# Altium footprint library Austindetz_CM4_Board_v1.0.PcbLib: 102 footprints (part 6 of 7)
Each footprint in its own frame and in the unit in brackets; x right, y up, seen from the top. Pads: shape width x height; smd on the part's side, far side on the other; paste and mask are expansions set on the pad; w line width, h text height; cw(c..) or ccw(c..) is an arc to the next point about the centre after c.
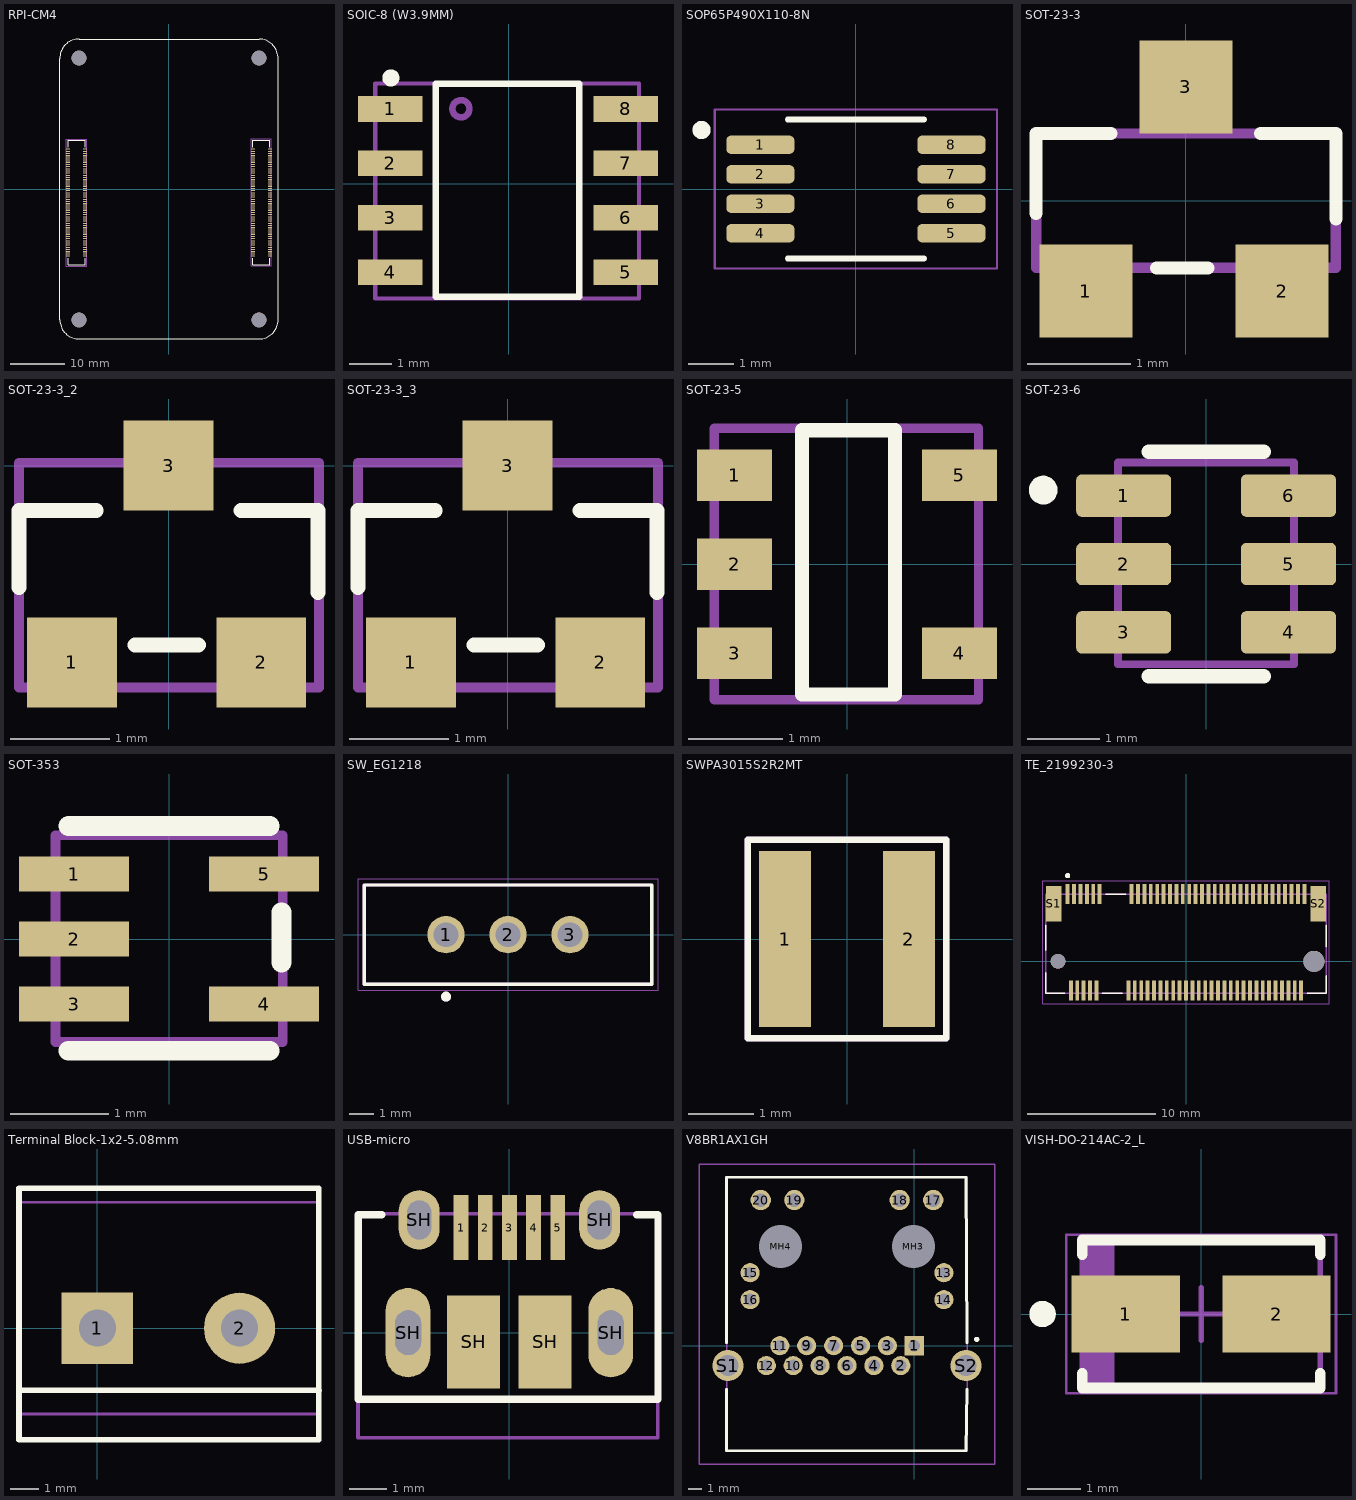
[diagram p5: the footprints below, top view; thin cyan lines are the x and y axes]

## RPI-CM4 [mm]
pads (204):
  rect 0.7x0.2 smd mask+0.07: 1(-18.5,7.3) 2(-15.42,7.3) 3(-18.5,6.9) 4(-15.42,6.9) 5(-18.5,6.5) 6(-15.42,6.5) 7(-18.5,6.1) 8(-15.42,6.1) 9(-18.5,5.7) 10(-15.42,5.7) 11(-18.5,5.3) 12(-15.42,5.3) 13(-18.5,4.9) 14(-15.42,4.9) 15(-18.5,4.5) 16(-15.42,4.5) 17(-18.5,4.1) 18(-15.42,4.1) 19(-18.5,3.7) 20(-15.42,3.7) 21(-18.5,3.3) 22(-15.42,3.3) 23(-18.5,2.9) 24(-15.42,2.9) 25(-18.5,2.5) 26(-15.42,2.5) 27(-18.5,2.1) 28(-15.42,2.1) 29(-18.5,1.7) 30(-15.42,1.7) 31(-18.5,1.3) 32(-15.42,1.3) 33(-18.5,0.9) 34(-15.42,0.9) 35(-18.5,0.5) 36(-15.42,0.5) 37(-18.5,0.1) 38(-15.42,0.1) 39(-18.5,-0.3) 40(-15.42,-0.3) 41(-18.5,-0.7) 42(-15.42,-0.7) 43(-18.5,-1.1) 44(-15.42,-1.1) 45(-18.5,-1.5) 46(-15.42,-1.5) 47(-18.5,-1.9) 48(-15.42,-1.9) 49(-18.5,-2.3) 50(-15.42,-2.3) 51(-18.5,-2.7) 52(-15.42,-2.7) 53(-18.5,-3.1) 54(-15.42,-3.1) 55(-18.5,-3.5) 56(-15.42,-3.5) 57(-18.5,-3.9) 58(-15.42,-3.9) 59(-18.5,-4.3) 60(-15.42,-4.3) 61(-18.5,-4.7) 62(-15.42,-4.7) 63(-18.5,-5.1) 64(-15.42,-5.1) 65(-18.5,-5.5) 66(-15.42,-5.5) 67(-18.5,-5.9) 68(-15.42,-5.9) 69(-18.5,-6.3) 70(-15.42,-6.3) 71(-18.5,-6.7) 72(-15.42,-6.7) 73(-18.5,-7.1) 74(-15.42,-7.1) 75(-18.5,-7.5) 76(-15.42,-7.5) 77(-18.5,-7.9) 78(-15.42,-7.9) 79(-18.5,-8.3) 80(-15.42,-8.3) 81(-18.5,-8.7) 82(-15.42,-8.7) 83(-18.5,-9.1) 84(-15.42,-9.1) 85(-18.5,-9.5) 86(-15.42,-9.5) 87(-18.5,-9.9) 88(-15.42,-9.9) 89(-18.5,-10.3) 90(-15.42,-10.3) 91(-18.5,-10.7) 92(-15.42,-10.7) 93(-18.5,-11.1) 94(-15.42,-11.1) 95(-18.5,-11.5) 96(-15.42,-11.5) 97(-18.5,-11.9) 98(-15.42,-11.9) 99(-18.5,-12.3) 100(-15.42,-12.3) 101(15.42,7.3) 102(18.5,7.3) 103(15.42,6.9) 104(18.5,6.9) 105(15.42,6.5) 106(18.5,6.5) 107(15.42,6.1) 108(18.5,6.1) 109(15.42,5.7) 110(18.5,5.7) 111(15.42,5.3) 112(18.5,5.3) 113(15.42,4.9) 114(18.5,4.9) 115(15.42,4.5) 116(18.5,4.5) 117(15.42,4.1) 118(18.5,4.1) 119(15.42,3.7) 120(18.5,3.7) 121(15.42,3.3) 122(18.5,3.3) 123(15.42,2.9) 124(18.5,2.9) 125(15.42,2.5) 126(18.5,2.5) 127(15.42,2.1) 128(18.5,2.1) 129(15.42,1.7) 130(18.5,1.7) 131(15.42,1.3) 132(18.5,1.3) 133(15.42,0.9) 134(18.5,0.9) 135(15.42,0.5) 136(18.5,0.5) 137(15.42,0.1) 138(18.5,0.1) 139(15.42,-0.3) 140(18.5,-0.3) 141(15.42,-0.7) 142(18.5,-0.7) 143(15.42,-1.1) 144(18.5,-1.1) 145(15.42,-1.5) 146(18.5,-1.5) 147(15.42,-1.9) 148(18.5,-1.9) 149(15.42,-2.3) 150(18.5,-2.3) 151(15.42,-2.7) 152(18.5,-2.7) 153(15.42,-3.1) 154(18.5,-3.1) 155(15.42,-3.5) 156(18.5,-3.5) 157(15.42,-3.9) 158(18.5,-3.9) 159(15.42,-4.3) 160(18.5,-4.3) 161(15.42,-4.7) 162(18.5,-4.7) 163(15.42,-5.1) 164(18.5,-5.1) 165(15.42,-5.5) 166(18.5,-5.5) 167(15.42,-5.9) 168(18.5,-5.9) 169(15.42,-6.3) 170(18.5,-6.3) 171(15.42,-6.7) 172(18.5,-6.7) 173(15.42,-7.1) 174(18.5,-7.1) 175(15.42,-7.5) 176(18.5,-7.5) 177(15.42,-7.9) 178(18.5,-7.9) 179(15.42,-8.3) 180(18.5,-8.3) 181(15.42,-8.7) 182(18.5,-8.7) 183(15.42,-9.1) 184(18.5,-9.1) 185(15.42,-9.5) 186(18.5,-9.5) 187(15.42,-9.9) 188(18.5,-9.9) 189(15.42,-10.3) 190(18.5,-10.3) 191(15.42,-10.7) 192(18.5,-10.7) 193(15.42,-11.1) 194(18.5,-11.1) 195(15.42,-11.5) 196(18.5,-11.5) 197(15.42,-11.9) 198(18.5,-11.9) 199(15.42,-12.3) 200(18.5,-12.3)
  round 2.7 hole 2.7 unplated: none(-16.5,-24) none(-16.5,24) none(16.5,-24) none(16.5,24)
Top Overlay:
  lines w0.2: -20.001,-23.994 ccw(c-16.5,-24) -16.451,-27.501 -13.8,-27.5 12.2,-27.5 16.595,-27.5 ; -20,-23.994 -20,-21.3 -20,7.3 -20,15.4 -20,23.919 cw(c-16.5,24) -16.471,27.501 -7.9,27.5 8.4,27.5 16.581,27.5 cw(c16.5,24) 20,23.919 ; -18.5,-12.7 -18.5,-13.9 -15.4,-13.9 -15.4,-12.7 ; -18.5,7.7 -18.5,8.9 -15.4,8.9 -15.4,7.7 ; 15.4,-12.7 15.4,-13.9 18.5,-13.9 18.5,-12.7 ; 15.4,7.7 15.4,8.9 18.5,8.9 18.5,7.7 ; 16.595,-27.5 ccw(c16.5,-24) 20.001,-24 ; 20,-24 20,-19.7 20,15.9 20,24
Top Assembly:
  lines w0.11: -18.81,-14.19 -15.07,-14.19 -15.07,9.13 -18.59,9.13 -18.81,9.13 -18.81,-14.19 ; 15.042,-14.105 18.782,-14.105 18.782,9.215 15.262,9.215 15.042,9.215 15.042,-14.105
  text "'.Designator'" at -1.482,-2.489 h2
3D body "xxxxxx.STEP": height 1.43, standoff -0.02, extent 15.263,-13.799 18.643,8.801
3D body "xxxxxx.STEP": height 1.43, standoff -0.02, extent -18.633,-13.8 -15.253,8.8

## SOIC-8 (W3.9MM) [mm]
pads (8):
  rect 1.5x0.6 smd: 1(-2.771,1.746) 2(-2.771,0.476) 3(-2.771,-0.794) 4(-2.771,-2.064) 5(2.729,-2.064) 6(2.729,-0.794) 7(2.729,0.476) 8(2.729,1.746)
Top Overlay:
  circle w0.2: c-2.754,2.469 r0.1
  lines w0.15: 1.6,-2.64 -1.65,-2.64 -1.71,-2.64 -1.71,2.33 -1.61,2.33 1.64,2.33 1.64,-2.64
Top Assembly:
  circle w0.15: c-1.12,1.75 r0.2
  lines w0.1: -3.122,-2.677 3.035,-2.677 3.035,2.341 -3.122,2.341 -3.122,-2.677
  text "'.Designator'" at -0.309,0.616 h1.27
3D body "SOIC08 Tl7660.STEP": height 1.98, standoff -0.02, extent -3.136,-2.664 3.027,2.336

## SOP65P490X110-8N [mm]
height 0.89
pads (8):
  rrect50% 1.5x0.4 smd mask+0.05: 1(-2.105,0.975) 2(-2.105,0.325) 3(-2.105,-0.325) 4(-2.105,-0.975) 5(2.105,-0.975) 6(2.105,-0.325) 7(2.105,0.325) 8(2.105,0.975)
Top Overlay:
  circle w0.2: c-3.4,1.3 r0.1
  lines w0.127: -1.5,-1.534 1.5,-1.534 ; -1.5,1.534 1.5,1.534
Mechanical 15:
  lines w0.05: -3.11,-1.75 3.11,-1.75 3.11,1.75 -3.11,1.75 -3.11,-1.75
3D body "step_temp.STEP": height 1.1, standoff 0, extent -2.45,-1.5 2.45,1.5

## SOT-23-3 [mm]
pads (3):
  rect 0.9x0.9 smd: 1(-0.969,-0.876) 2(0.931,-0.876) 3(0,1.1)
Top Overlay:
  lines w0.127: -1.451,-0.126 -1.451,0.65 -0.725,0.65 ; -0.285,-0.655 0.215,-0.655 ; 0.725,0.65 1.454,0.65 1.454,-0.176
Top Assembly:
  lines w0.1: -1.45,-0.65 -1.45,0.65 1.45,0.65 1.45,-0.65 -1.45,-0.65
  text "'.Designator'" at -3.1,-2.5 h1.27
3D body "SOT23.STEP": height 1.2, standoff -0.02, extent -1.513,-1.11 1.487,1.142

## SOT-23-3_2 [mm]
pads (3):
  rect 0.9x0.9 smd: 1(-0.969,-1.976) 2(0.931,-1.976) 3(0,0)
Top Overlay:
  lines w0.15: -1.5,-1.226 -1.5,-0.45 -0.725,-0.45 ; -0.335,-1.8 0.3,-1.8 ; 0.725,-0.45 1.5,-0.45 1.5,-1.276
Top Assembly:
  lines w0.1: -1.5,-2.227 -1.5,0.028 1.51,0.028 1.51,-2.227 -1.5,-2.227
  text "'.Designator'" at -3.1,-3.6 h1.27
3D body "SOT23.STEP": height 1.2, standoff -0.02, extent -1.513,-2.21 1.487,0.042

## SOT-23-3_3 [mm]
pads (3):
  rect 0.9x0.9 smd: 1(-0.969,-1.976) 2(0.931,-1.976) 3(0,0)
Top Overlay:
  lines w0.15: -1.5,-1.226 -1.5,-0.45 -0.725,-0.45 ; -0.335,-1.8 0.3,-1.8 ; 0.725,-0.45 1.5,-0.45 1.5,-1.276
Top Assembly:
  lines w0.1: -1.5,-2.227 1.51,-2.227 1.51,0.028 -1.5,0.028 -1.5,-2.227
  text "'.Designator'" at -3.1,-3.6 h1.27
3D body "SOT23.STEP": height 1.2, standoff -0.02, extent -1.513,-2.21 1.487,0.042

## SOT-23-5 [mm] "SOT23, 5-Leads, Body 3.00x2.85mm, Pitch 0.95mm, IPC Medium Density"
height 1.3
pads (5):
  rect 0.8x0.55 smd: 1(-1.2,0.95) 2(-1.2,0) 3(-1.2,-0.95) 4(1.2,-0.95) 5(1.2,0.95)
Top Overlay:
  lines w0.15: -0.48,-1.39 -0.48,1.43 0.51,1.43 0.51,-1.39 -0.48,-1.39
Top Assembly:
  lines w0.1: -1.415,-1.445 1.402,-1.445 1.402,1.451 -1.415,1.451 -1.415,-1.445
  text "'.Designator'" at -2.937,-2.49 h1.27
3D body "SOT-23-5.STEP": height 1.5, standoff 0, extent -1.41,-1.45 1.411,1.45

## SOT-23-6 [mm]
pads (6):
  rrect25% 1.32x0.59 smd: 1(-1.145,0.95) 2(-1.145,0) 3(-1.145,-0.95) 4(1.145,-0.95) 5(1.145,0) 6(1.145,0.95)
Top Overlay:
  circle w0.2: c-2.264,1.027 r0.1
  lines w0.2: -0.8,-1.56 0.8,-1.56 ; -0.8,1.56 0.8,1.56
Top Assembly:
  circle w0.2: c-0.793,0.967 r0.1
  lines w0.11: -1.222,-1.393 -1.222,1.413 -1.207,1.413 1.221,1.413 1.221,-1.393 -1.222,-1.393
  text "'.Designator'" at -3.613,-2.754 h1.27
3D body "User Library-SOT23-6-1.STEP": height 1.09, standoff 0, extent -1.211,-1.389 1.215,1.405

## SOT-353 [mil]
pads (5):
  rect 44x14 smd: 1(-38,26) 2(-38,0) 3(-38,-26) 4(38,-26) 5(38,26)
Top Overlay:
  lines w7.87: -40.17,-44.71 40.27,-44.71 ; -40.17,45.2 40.27,45.2 ; 45.02,-9.43 45.02,10.68
Top Assembly:
  lines w3.94: -45.44,-41.22 -45.44,41.49 45.53,41.49 45.53,-41.22 -45.44,-41.22
  text "'.Designator'" at -25.67,-14.62 h50
3D body "User Library-sot353.STEP": height 39.37, standoff 0, extent -45.28,-41.34 45.28,41.34

## SW_EG1218 [mm]
pads (3):
  round 1.508 hole 1 mask+0.05: 1(-2.5,0) 2(0,0) 3(2.5,0)
Top Overlay:
  circle w0.2: c-2.5,-2.5 r0.1
  lines w0.127: -5.8,-2 5.8,-2 5.8,2 -5.8,2 -5.8,-2
Mechanical 13:
  circle w0.2: c-2.5,-2.5 r0.1
  lines w0.127: -5.8,-2 5.8,-2 5.8,2 -5.8,2 -5.8,-2
Mechanical 15:
  lines w0.05: -6.05,-2.25 6.05,-2.25 6.05,2.25 -6.05,2.25 -6.05,-2.25
3D body "step_temp.STEP": height 7, standoff -5.1, extent -5.8,-2 5.8,2

## SWPA3015S2R2MT [mm]
height 1.6
pads (2):
  rect 0.8x2.7 smd: 1(-0.95,0) 2(0.95,0)
Top Overlay:
  lines w0.102: -1.524,-1.524 1.524,-1.524 1.524,1.524 -1.524,1.524 -1.524,-1.524
Top 3D Body:
  lines w0.102: -1.524,-1.524 -1.524,1.524 1.524,1.524 1.524,-1.524 -1.524,-1.524
3D body: height 1.5, standoff 0, extent -1.524,-1.524 1.524,1.524

## TE_2199230-3 [mm]
height 13.32
pads (71):
  rect 0.3x1.55 smd: 1(-9.25,5.275) 2(-9,-2.275) 3(-8.75,5.275) 4(-8.5,-2.275) 5(-8.25,5.275) 6(-8,-2.275) 7(-7.75,5.275) 8(-7.5,-2.275) 9(-7.25,5.275) 10(-7,-2.275) 11(-6.75,5.275) 20(-4.5,-2.275) 21(-4.25,5.275) 22(-4,-2.275) 23(-3.75,5.275) 24(-3.5,-2.275) 25(-3.25,5.275) 26(-3,-2.275) 27(-2.75,5.275) 28(-2.5,-2.275) 29(-2.25,5.275) 30(-2,-2.275) 31(-1.75,5.275) 32(-1.5,-2.275) 33(-1.25,5.275) 34(-1,-2.275) 35(-0.75,5.275) 36(-0.5,-2.275) 37(-0.25,5.275) 38(0,-2.275) 39(0.25,5.275) 40(0.5,-2.275) 41(0.75,5.275) 42(1,-2.275) 43(1.25,5.275) 44(1.5,-2.275) 45(1.75,5.275) 46(2,-2.275) 47(2.25,5.275) 48(2.5,-2.275) 49(2.75,5.275) 50(3,-2.275) 51(3.25,5.275) 52(3.5,-2.275) 53(3.75,5.275) 54(4,-2.275) 55(4.25,5.275) 56(4.5,-2.275) 57(4.75,5.275) 58(5,-2.275) 59(5.25,5.275) 60(5.5,-2.275) 61(5.75,5.275) 62(6,-2.275) 63(6.25,5.275) 64(6.5,-2.275) 65(6.75,5.275) 66(7,-2.275) 67(7.25,5.275) 68(7.5,-2.275) 69(7.75,5.275) 70(8,-2.275) 71(8.25,5.275) 72(8.5,-2.275) 73(8.75,5.275) 74(9,-2.275) 75(9.25,5.275)
  rect 1.2x2.75 smd: S1(-10.35,4.5) S2(10.35,4.5)
  round 1.15 hole 1.15 unplated: ""(-10,0)
  round 1.65 hole 1.65 unplated: ""(10,0)
Top Overlay:
  circle w0.2: c-9.25,6.7 r0.1
  lines w0.127: -10.95,-0.895 -10.95,-2.5 -9.47,-2.5 ; -10.95,0.895 -10.95,2.805 ; -6.53,-2.5 -4.97,-2.5 ; -6.28,5.25 -4.72,5.25 ; 9.47,-2.5 10.95,-2.5 10.95,-1.145 ; 10.95,1.145 10.95,2.805
Mechanical 13:
  circle w0.2: c-9.25,6.7 r0.1
  lines w0.127: -10.95,-2.5 -10.95,5.25 10.95,5.25 10.95,-2.5 -10.95,-2.5
Mechanical 15:
  lines w0.05: -11.2,-3.3 -11.2,6.3 11.2,6.3 11.2,-3.3 -11.2,-3.3
3D body "2199230-3.step": height 4.09, standoff -0.62, extent -10.951,-2.85 10.949,5.85

## Terminal Block-1x2-5.08mm [mil]
height 0.51
pads (2):
  rect 100x100 hole 52: 1(0,0)
  round 100 hole 52: 2(200,0)
Top Overlay:
  lines w7.87: -108.18,-87.09 311.61,-87.54 ; -110.06,-157 -110.06,197 311.52,197 311.52,-157 -110.06,-157
Top Assembly:
  lines w3.94: -108.28,-120.64 310.33,-120.64 310.33,177.17 -108.28,177.17 -108.28,-120.64
  text "'.Designator'" at -38.27,93.82 h50
3D body "tb5p-2p_p5_l10_w7-6_h10.stp": height 398.03, standoff -157.09, extent -107.83,-123.14 309.49,176.07

## USB-micro [mm]
pads (11):
  rect 0.4x1.75 smd: 1(-1.3,2.825) 2(-0.65,2.825) 3(0,2.825) 4(0.65,2.825) 5(1.3,2.825)
  oval 1.2x2.4 hole 0.7 slot 1.2 at 90 deg: SH(-2.725,0) SH(2.725,0)
  oval 1.1x1.6 hole 0.65 slot 1.05 at 90 deg: SH(-2.425,3.03) SH(2.425,3.03)
  rect 1.425x2.5 smd: SH(-0.962,-0.25) SH(0.962,-0.25)
Top Overlay:
  lines w0.2: -3.429,3.175 -4.064,3.175 -4.064,-1.789 -3.75,-1.789 1.906,-1.789 3.75,-1.789 3.996,-1.789 3.996,3.175 3.429,3.175
Top 3D Body:
  lines w0: -2.745,-0.6 -2.705,-0.6 ; -2.745,0.6 -2.705,0.6 ; 2.705,-0.6 2.745,-0.6 ; 2.705,0.6 2.745,0.6
Top Assembly:
  lines w0.1: -4.07,-2.826 3.987,-2.826 3.987,3.201 -3.203,3.201 -4.07,3.201 -4.07,-2.826
  text "'.Designator'" at -5.381,4.524 h2
3D body "step_temp.STEP": height 2.92, standoff -0.68, extent -4.035,-2.829 4.005,3.204

## V8BR1AX1GH [mm]
pads (24):
  rect 1.446x1.446 hole 0.89: 1(0,0)
  round 1.446 hole 0.89: 2(-1.02,-1.5) 3(-2.03,0) 4(-3.05,-1.5) 5(-4.06,0) 6(-5.08,-1.5) 7(-6.09,0) 8(-7.11,-1.5) 9(-8.12,0) 10(-9.14,-1.5) 11(-10.15,0) 12(-11.17,-1.5) 13(2.235,5.51) 14(2.235,3.48) 15(-12.395,5.51) 16(-12.395,3.48)
  round 1.53 hole 1.02: 17(1.435,11) 18(-1.105,11) 19(-9.055,11) 20(-11.595,11)
  round 1.625 hole 3.25 unplated: MH3(-0.075,7.49) MH4(-10.085,7.49)
  round 2.355 hole 1.57: S1(-14.07,-1.5) S2(3.91,-1.5)
Top Overlay:
  lines w0.2: -14.175,-3.28 -14.175,-7.93 3.91,-7.93 3.985,-3.28 ; -14.175,0.22 -14.175,12.72 3.91,12.72 3.985,0.22 ; 4.615,0.477 cw(c4.715,0.477) 4.815,0.477 cw(c4.715,0.477) 4.615,0.477
Mechanical 15:
  lines w0.1: -14.175,-7.93 -14.175,12.72 3.985,12.72 3.985,-7.93 -14.175,-7.93
Mechanical 20:
  lines w0.1: -16.248,-8.93 -16.248,13.72 6.088,13.72 6.088,-8.93 -16.248,-8.93
3D body "V8BR-1AX1-GH.stp": height 16.97, standoff -3.25, extent -14.376,-7.925 4.216,12.725

## VISH-DO-214AC-2_L [mm] "DO-214AC, 2-Leads, Body 4.5x2.79mm, IPC High Density"
height 2.29
pads (2):
  rect 2.05x1.45 smd: 1(-1.425,0) 2(1.425,0)
Top Overlay:
  circle w0.25: c-3,0 r0.125
  lines w0.2: -2.25,-1.125 -2.25,-1.4 2.25,-1.4 2.25,-1.125 ; -2.25,1.125 -2.25,1.4 2.25,1.4 2.25,1.125
Mechanical 13:
  rectangle: -2.25,-1.395 -1.645,1.395
  lines w0.1: -2.25,-1.395 2.25,-1.395 2.25,1.395 -2.25,1.395 -2.25,-1.395
Mechanical 15:
  lines w0.05: -2.55,-1.5 2.55,-1.5 2.55,1.5 -2.55,1.5 -2.55,-1.5
  lines w0.1: -0.5,0 0.5,0 ; 0,-0.5 0,0.5
3D body: height 2.29, standoff 0, extent -2.25,-1.395 2.25,1.395